# Altium schematic symbol library TI - ADC.SchLib: 2198 symbols (part 41 of 130)
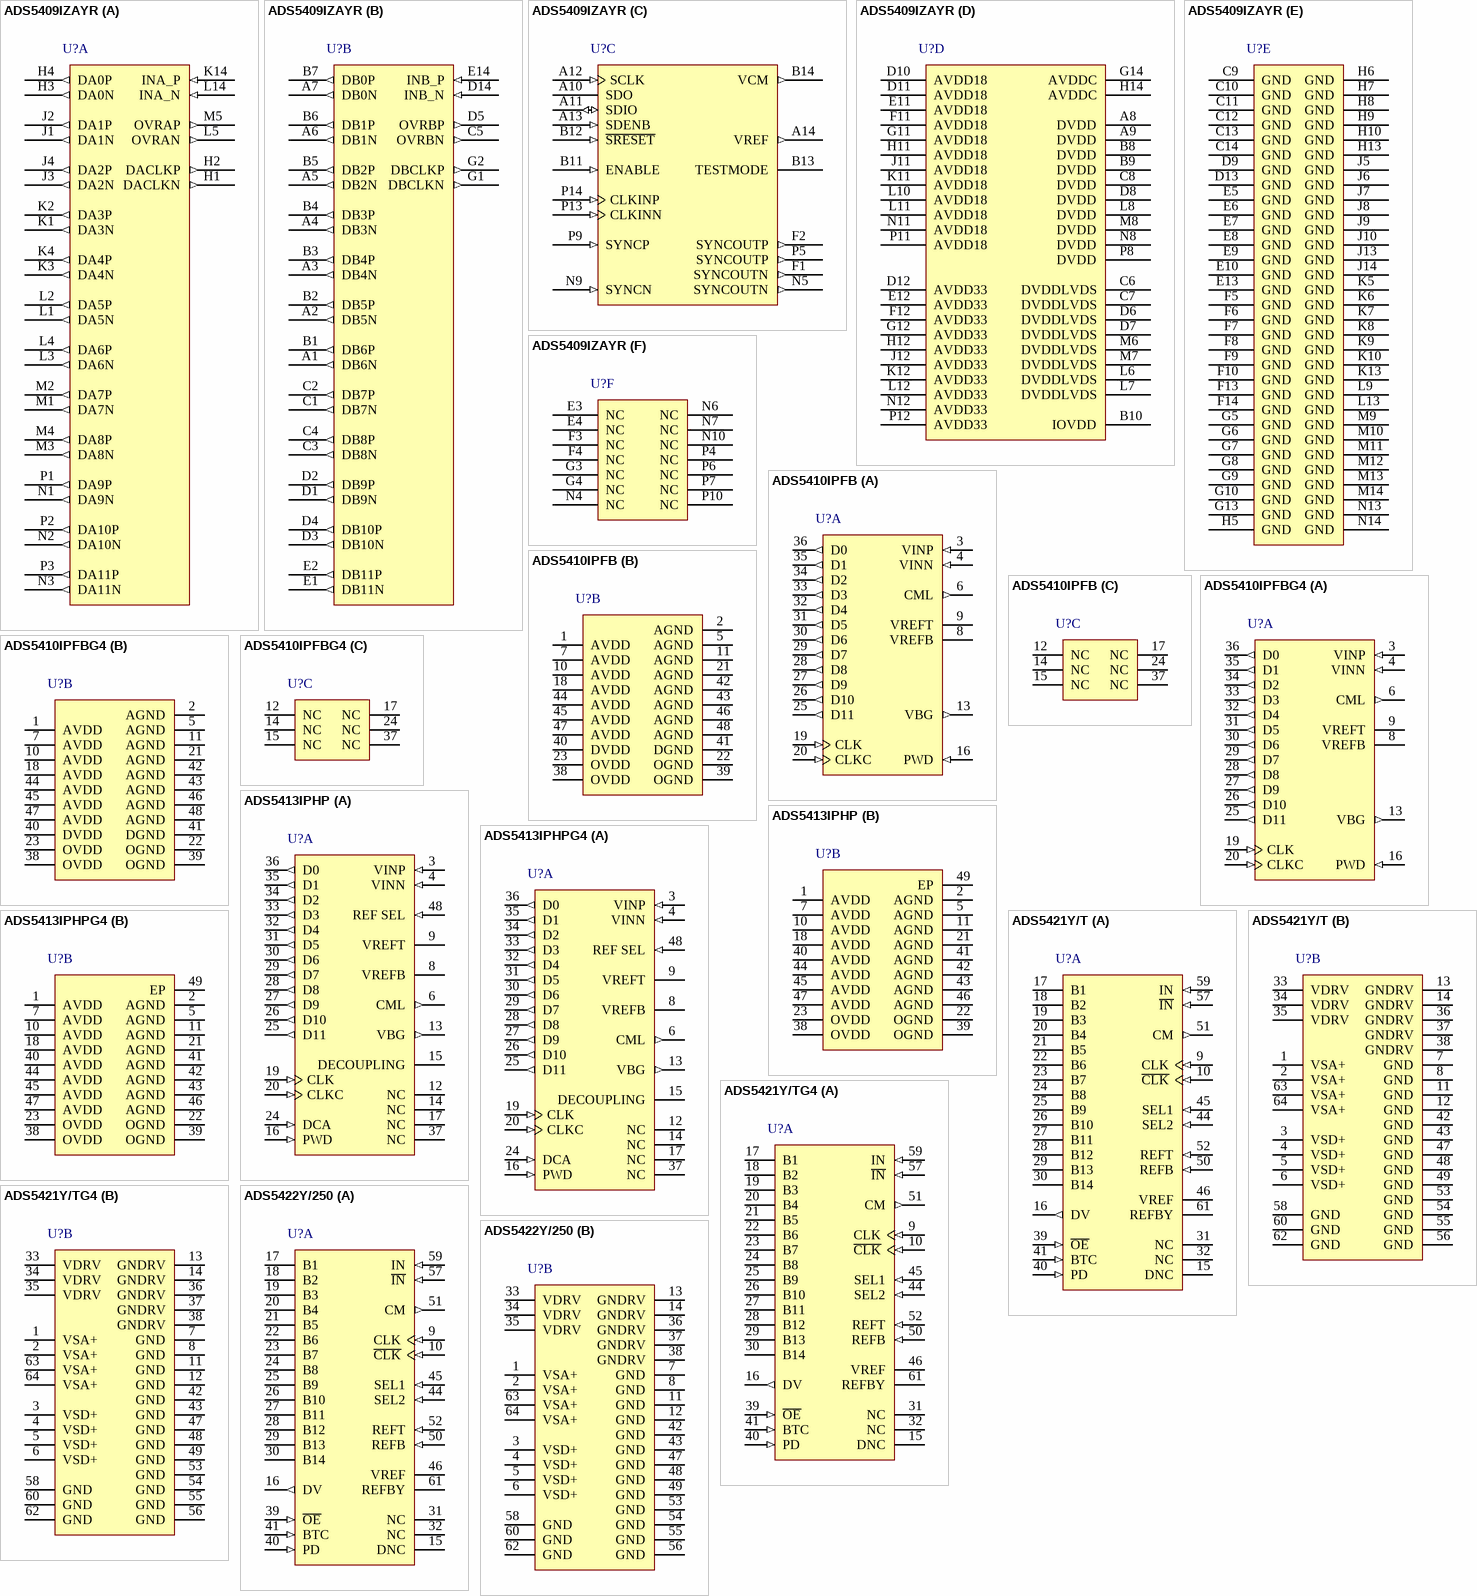
[diagram p166: symbols ADS5409IZAYR to ADS5422Y/250]

## ADS5421Y/T
designator U?
14-Bit, 40 MSPS Sampling ADC, -40 to 85 degC, 64-pin QFP (PM64), Green (RoHS & no Sb/Br); Manufacturer: Texas Instruments; PartNumber: ADS5421Y/T; # Input Channels: 1; Analog Voltage AV/DD(Max)(V): 5.25; Analog Voltage AV/DD(Min)(V): 4.75; Architecture: Pipeline; Digital Supply(Max)(V): 5; Digital Supply(Min)(V): 3; ENOB(Bits): 12.2; Interface: Parallel LVDS, Serial SPI Interface; Resolution(Bits): 14; Sample Rate (max)(SPS): 40M; SFDR(dB): 88; SINAD(dB): 75; SNR(dB): 76; SubFamily: High Speed ADC (>10MSPS); DatasheetVersion: SBAS237E; PackageVersion: 4040152/C, 11/1996; PackageReference: PM64; PackageDescription: 64-Pin Plastic Quad Flatpack, Body 10 x 10 mm, Pitch 0.5 mm; Supplier 1: Digi-Key; Supplier Part Number 1: ADS1602IPFBR-ND; Eco-Plan: Green (RoHS & no Sb/Br); Mounting Technology: Surface Mount; Code_JEDEC: MS-026; ComponentLink1Description: Manufacturer URL; ComponentLink1URL: http://www.ti.com/; ComponentLink2Description: Datasheet; ComponentLink2URL: http://www.ti.com/general/docs/lit/getliterature.tsp?genericPartNumber=ADS5421&fileType=pdf; ComponentLink3Description: Package Specification; ComponentLink3URL: http://www.ti.com/lit/ml/mtqf008a/mtqf008a.pdf
footprint TI-PM64_N (QFP, 64-Leads, Body 10x10mm, Pitch 0.5mm, IPC Medium Density)
footprint TI-PM64_L (QFP, 64-Leads, Body 10x10mm, Pitch 0.5mm, IPC High Density)
footprint TI-PM64_M (QFP, 64-Leads, Body 10x10mm, Pitch 0.5mm, IPC Low Density)
part A pins: 9 CLK (in) "Clock Input", 10 ~{CLK} (in) "Complementary Clock Input", 15 DNC "Do Not Connect", 16 DV (out) "Data Valid Pulse: HI = Data Valid", 17 B1 (hiz) "Data Bit 1 (D13) (MSB)", 18 B2 (hiz) "Data Bit 2 (D12)", 19 B3 (hiz) "Data Bit 3 (D11)", 20 B4 (hiz) "Data Bit 4 (D10)", 21 B5 (hiz) "Data Bit 5 (D9)", 22 B6 (hiz) "Data Bit 6 (D8)", 23 B7 (hiz) "Data Bit 7 (D7)", 24 B8 (hiz) "Data Bit 8 (D6)", 25 B9 (hiz) "Data Bit 9 (D5)", 26 B10 (hiz) "Data Bit 10 (D4)", 27 B11 (hiz) "Data Bit 11 (D3)", 28 B12 (hiz) "Data Bit 12 (D2)", 29 B13 (hiz) "Data Bit 13 (D1)", 30 B14 (hiz) "Data Bit 14 (D0) (LSB)", 31 NC "No Internal Connection", 32 NC "No Internal Connection", 39 ~{OE} (in) "Output Enable: HI = High Impedance", 40 PD (in) "Power Down: HI = Power Down; LO = Normal", 41 BTC (in) "HI = Binary Two‘s Complement", 44 SEL2 (in) "Reference Select 2: See Table on Page 5", 45 SEL1 (in) "Reference Select 1: See Table on Page 5", 46 VREF "Internal Reference Voltage", 50 REFB (in) "Bottom Reference Voltage Bypass", 51 CM (out) "Common-Mode Voltage (Midscale)", 52 REFT (in) "Top Reference Voltage Bypass", 57 ~{IN} (in) "Complementary Analog Input", 59 IN (in) "Analog Input", 61 REFBY "Reference Bypass"
part B pins: 1 VSA+ (power) "Analog Supply Voltage", 2 VSA+ (power) "Analog Supply Voltage", 3 VSD+ (power) "Digital Supply Voltage", 4 VSD+ (power) "Digital Supply Voltage", 5 VSD+ (power) "Digital Supply Voltage", 6 VSD+ (power) "Digital Supply Voltage", 7 GND (power) "Ground", 8 GND (power) "Ground", 11 GND (power) "Ground", 12 GND (power) "Ground", 13 GNDRV (power) "Ground", 14 GNDRV (power) "Ground", 33 VDRV (power) "Output Driver Supply Voltage", 34 VDRV (power) "Output Driver Supply Voltage", 35 VDRV (power) "Output Driver Supply Voltage", 36 GNDRV (power) "Ground", 37 GNDRV (power) "Ground", 38 GNDRV (power) "Ground", 42 GND (power) "Ground", 43 GND (power) "Ground", 47 GND (power) "Ground", 48 GND (power) "Ground", 49 GND (power) "Ground", 53 GND (power) "Ground", 54 GND (power) "Ground", 55 GND (power) "Ground", 56 GND (power) "Ground", 58 GND (power) "Ground", 60 GND (power) "Ground", 62 GND (power) "Ground", 63 VSA+ (power) "Analog Supply Voltage", 64 VSA+ (power) "Analog Supply Voltage"

## ADS5421Y/TG4
designator U?
14-Bit, 40 MSPS Sampling ADC, -40 to 85 degC, 64-pin QFP (PM64), Green (RoHS & no Sb/Br); Manufacturer: Texas Instruments; PartNumber: ADS5421Y/TG4; # Input Channels: 1; Analog Voltage AV/DD(Max)(V): 5.25; Analog Voltage AV/DD(Min)(V): 4.75; Architecture: Pipeline; Digital Supply(Max)(V): 5; Digital Supply(Min)(V): 3; ENOB(Bits): 12.2; Interface: Parallel LVDS, Serial SPI Interface; Resolution(Bits): 14; Sample Rate (max)(SPS): 40M; SFDR(dB): 88; SINAD(dB): 75; SNR(dB): 76; SubFamily: High Speed ADC (>10MSPS); DatasheetVersion: SBAS237E; PackageVersion: 4040152/C, 11/1996; PackageReference: PM64; PackageDescription: 64-Pin Plastic Quad Flatpack, Body 10 x 10 mm, Pitch 0.5 mm; Supplier 1: Digi-Key; Supplier Part Number 1: ADS1602IPFBRG4-ND; Eco-Plan: Green (RoHS & no Sb/Br); Mounting Technology: Surface Mount; Code_JEDEC: MS-026; ComponentLink1Description: Manufacturer URL; ComponentLink1URL: http://www.ti.com/; ComponentLink2Description: Datasheet; ComponentLink2URL: http://www.ti.com/general/docs/lit/getliterature.tsp?genericPartNumber=ADS5421&fileType=pdf; ComponentLink3Description: Package Specification; ComponentLink3URL: http://www.ti.com/lit/ml/mtqf008a/mtqf008a.pdf
footprint TI-PM64_N (QFP, 64-Leads, Body 10x10mm, Pitch 0.5mm, IPC Medium Density)
footprint TI-PM64_L (QFP, 64-Leads, Body 10x10mm, Pitch 0.5mm, IPC High Density)
footprint TI-PM64_M (QFP, 64-Leads, Body 10x10mm, Pitch 0.5mm, IPC Low Density)
part A pins: 9 CLK (in) "Clock Input", 10 ~{CLK} (in) "Complementary Clock Input", 15 DNC "Do Not Connect", 16 DV (out) "Data Valid Pulse: HI = Data Valid", 17 B1 (hiz) "Data Bit 1 (D13) (MSB)", 18 B2 (hiz) "Data Bit 2 (D12)", 19 B3 (hiz) "Data Bit 3 (D11)", 20 B4 (hiz) "Data Bit 4 (D10)", 21 B5 (hiz) "Data Bit 5 (D9)", 22 B6 (hiz) "Data Bit 6 (D8)", 23 B7 (hiz) "Data Bit 7 (D7)", 24 B8 (hiz) "Data Bit 8 (D6)", 25 B9 (hiz) "Data Bit 9 (D5)", 26 B10 (hiz) "Data Bit 10 (D4)", 27 B11 (hiz) "Data Bit 11 (D3)", 28 B12 (hiz) "Data Bit 12 (D2)", 29 B13 (hiz) "Data Bit 13 (D1)", 30 B14 (hiz) "Data Bit 14 (D0) (LSB)", 31 NC "No Internal Connection", 32 NC "No Internal Connection", 39 ~{OE} (in) "Output Enable: HI = High Impedance", 40 PD (in) "Power Down: HI = Power Down; LO = Normal", 41 BTC (in) "HI = Binary Two‘s Complement", 44 SEL2 (in) "Reference Select 2: See Table on Page 5", 45 SEL1 (in) "Reference Select 1: See Table on Page 5", 46 VREF "Internal Reference Voltage", 50 REFB (in) "Bottom Reference Voltage Bypass", 51 CM (out) "Common-Mode Voltage (Midscale)", 52 REFT (in) "Top Reference Voltage Bypass", 57 ~{IN} (in) "Complementary Analog Input", 59 IN (in) "Analog Input", 61 REFBY "Reference Bypass"
part B pins: 1 VSA+ (power) "Analog Supply Voltage", 2 VSA+ (power) "Analog Supply Voltage", 3 VSD+ (power) "Digital Supply Voltage", 4 VSD+ (power) "Digital Supply Voltage", 5 VSD+ (power) "Digital Supply Voltage", 6 VSD+ (power) "Digital Supply Voltage", 7 GND (power) "Ground", 8 GND (power) "Ground", 11 GND (power) "Ground", 12 GND (power) "Ground", 13 GNDRV (power) "Ground", 14 GNDRV (power) "Ground", 33 VDRV (power) "Output Driver Supply Voltage", 34 VDRV (power) "Output Driver Supply Voltage", 35 VDRV (power) "Output Driver Supply Voltage", 36 GNDRV (power) "Ground", 37 GNDRV (power) "Ground", 38 GNDRV (power) "Ground", 42 GND (power) "Ground", 43 GND (power) "Ground", 47 GND (power) "Ground", 48 GND (power) "Ground", 49 GND (power) "Ground", 53 GND (power) "Ground", 54 GND (power) "Ground", 55 GND (power) "Ground", 56 GND (power) "Ground", 58 GND (power) "Ground", 60 GND (power) "Ground", 62 GND (power) "Ground", 63 VSA+ (power) "Analog Supply Voltage", 64 VSA+ (power) "Analog Supply Voltage"

## ADS5422Y/250
designator U?
14-Bit, 62 MSPS Sampling ADC, -40 to 85 degC, 64-pin QFP (PM64), Green (RoHS & no Sb/Br); Manufacturer: Texas Instruments; PartNumber: ADS5422Y/250; # Input Channels: 1; Analog Voltage AV/DD(Max)(V): 5.25; Analog Voltage AV/DD(Min)(V): 4.75; Architecture: Pipeline; Digital Supply(Max)(V): 5; Digital Supply(Min)(V): 3; ENOB(Bits): 11.7; Interface: Parallel LVDS, Serial SPI Interface; Resolution(Bits): 14; Sample Rate (max)(SPS): 62M; SFDR(dB): 85; SINAD(dB): 72; SNR(dB): 73; SubFamily: High Speed ADC (>10MSPS); DatasheetVersion: SBAS250D; PackageVersion: 4040152/C, 11/1996; PackageReference: PM64; PackageDescription: 64-Pin Plastic Quad Flatpack, Body 10 x 10 mm, Pitch 0.5 mm; Supplier 1: Digi-Key; Supplier Part Number 1: 296-17890-2-ND; Eco-Plan: Green (RoHS & no Sb/Br); Mounting Technology: Surface Mount; Code_JEDEC: MS-026; ComponentLink1Description: Manufacturer URL; ComponentLink1URL: http://www.ti.com/; ComponentLink2Description: Datasheet; ComponentLink2URL: http://www.ti.com/general/docs/lit/getliterature.tsp?genericPartNumber=ADS5422&fileType=pdf; ComponentLink3Description: Package Specification; ComponentLink3URL: http://www.ti.com/lit/ml/mtqf008a/mtqf008a.pdf
footprint TI-PM64_N (QFP, 64-Leads, Body 10x10mm, Pitch 0.5mm, IPC Medium Density)
footprint TI-PM64_L (QFP, 64-Leads, Body 10x10mm, Pitch 0.5mm, IPC High Density)
footprint TI-PM64_M (QFP, 64-Leads, Body 10x10mm, Pitch 0.5mm, IPC Low Density)
part A pins: 9 CLK (in) "Clock Input", 10 ~{CLK} (in) "Complementary Clock Input", 15 DNC "Do Not Connect", 16 DV (out) "Data Valid Pulse: HI = Data Valid", 17 B1 (hiz) "Data Bit 1 (D13) (MSB)", 18 B2 (hiz) "Data Bit 2 (D12)", 19 B3 (hiz) "Data Bit 3 (D11)", 20 B4 (hiz) "Data Bit 4 (D10)", 21 B5 (hiz) "Data Bit 5 (D9)", 22 B6 (hiz) "Data Bit 6 (D8)", 23 B7 (hiz) "Data Bit 7 (D7)", 24 B8 (hiz) "Data Bit 8 (D6)", 25 B9 (hiz) "Data Bit 9 (D5)", 26 B10 (hiz) "Data Bit 10 (D4)", 27 B11 (hiz) "Data Bit 11 (D3)", 28 B12 (hiz) "Data Bit 12 (D2)", 29 B13 (hiz) "Data Bit 13 (D1)", 30 B14 (hiz) "Data Bit 14 (D0) (LSB)", 31 NC "No Internal Connection", 32 NC "No Internal Connection", 39 ~{OE} (in) "Output Enable: HI = High Impedance", 40 PD (in) "Power Down: HI = Power Down; LO = Normal", 41 BTC (in) "HI = Binary Two‘s Complement", 44 SEL2 (in) "Reference Select 2: See Table on Page 5", 45 SEL1 (in) "Reference Select 1: See Table on Page 5", 46 VREF "Internal Reference Voltage", 50 REFB (in) "Bottom Reference Voltage Bypass", 51 CM (out) "Common-Mode Voltage (Midscale)", 52 REFT (in) "Top Reference Voltage Bypass", 57 ~{IN} (in) "Complementary Analog Input", 59 IN (in) "Analog Input", 61 REFBY "Reference Bypass"
part B pins: 1 VSA+ (power) "Analog Supply Voltage", 2 VSA+ (power) "Analog Supply Voltage", 3 VSD+ (power) "Digital Supply Voltage", 4 VSD+ (power) "Digital Supply Voltage", 5 VSD+ (power) "Digital Supply Voltage", 6 VSD+ (power) "Digital Supply Voltage", 7 GND (power) "Ground", 8 GND (power) "Ground", 11 GND (power) "Ground", 12 GND (power) "Ground", 13 GNDRV (power) "Ground", 14 GNDRV (power) "Ground", 33 VDRV (power) "Output Driver Supply Voltage", 34 VDRV (power) "Output Driver Supply Voltage", 35 VDRV (power) "Output Driver Supply Voltage", 36 GNDRV (power) "Ground", 37 GNDRV (power) "Ground", 38 GNDRV (power) "Ground", 42 GND (power) "Ground", 43 GND (power) "Ground", 47 GND (power) "Ground", 48 GND (power) "Ground", 49 GND (power) "Ground", 53 GND (power) "Ground", 54 GND (power) "Ground", 55 GND (power) "Ground", 56 GND (power) "Ground", 58 GND (power) "Ground", 60 GND (power) "Ground", 62 GND (power) "Ground", 63 VSA+ (power) "Analog Supply Voltage", 64 VSA+ (power) "Analog Supply Voltage"

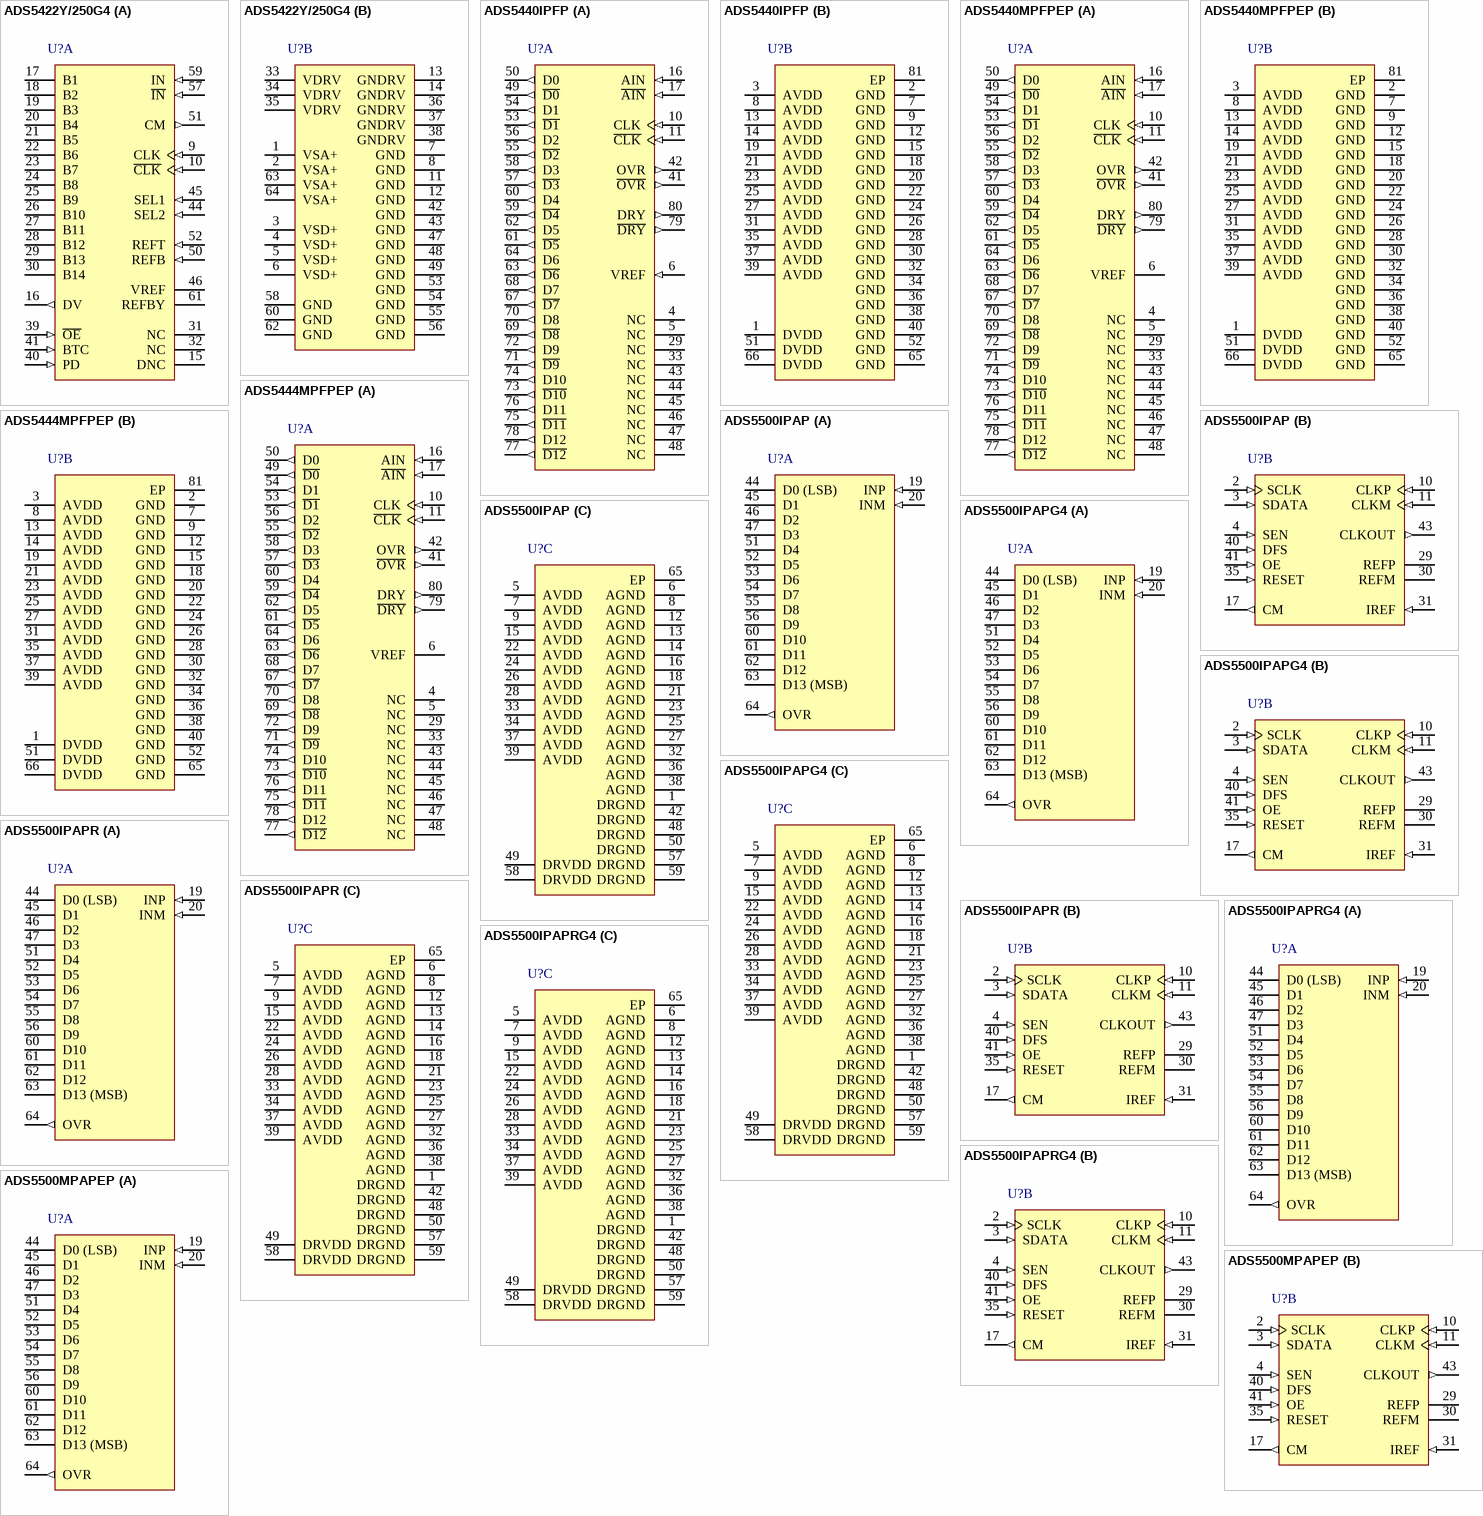
[diagram p51: symbols ADS5422Y/250G4 to ADS5500MPAPEP]

## ADS5422Y/250G4
designator U?
14-Bit, 62 MSPS Sampling ADC, -40 to 85 degC, 64-pin QFP (PM64), Green (RoHS & no Sb/Br); Manufacturer: Texas Instruments; PartNumber: ADS5422Y/250G4; # Input Channels: 1; Analog Voltage AV/DD(Max)(V): 5.25; Analog Voltage AV/DD(Min)(V): 4.75; Architecture: Pipeline; Digital Supply(Max)(V): 5; Digital Supply(Min)(V): 3; ENOB(Bits): 11.7; Interface: Parallel LVDS, Serial SPI Interface; Resolution(Bits): 14; Sample Rate (max)(SPS): 62M; SFDR(dB): 85; SINAD(dB): 72; SNR(dB): 73; SubFamily: High Speed ADC (>10MSPS); DatasheetVersion: SBAS250D; PackageVersion: 4040152/C, 11/1996; PackageReference: PM64; PackageDescription: 64-Pin Plastic Quad Flatpack, Body 10 x 10 mm, Pitch 0.5 mm; Supplier 1: Digi-Key; Supplier Part Number 1: ADS1602IPFBTG4-ND; Eco-Plan: Green (RoHS & no Sb/Br); Mounting Technology: Surface Mount; Code_JEDEC: MS-026; ComponentLink1Description: Manufacturer URL; ComponentLink1URL: http://www.ti.com/; ComponentLink2Description: Datasheet; ComponentLink2URL: http://www.ti.com/general/docs/lit/getliterature.tsp?genericPartNumber=ADS5422&fileType=pdf; ComponentLink3Description: Package Specification; ComponentLink3URL: http://www.ti.com/lit/ml/mtqf008a/mtqf008a.pdf
footprint TI-PM64_N (QFP, 64-Leads, Body 10x10mm, Pitch 0.5mm, IPC Medium Density)
footprint TI-PM64_L (QFP, 64-Leads, Body 10x10mm, Pitch 0.5mm, IPC High Density)
footprint TI-PM64_M (QFP, 64-Leads, Body 10x10mm, Pitch 0.5mm, IPC Low Density)
part A pins: 9 CLK (in) "Clock Input", 10 ~{CLK} (in) "Complementary Clock Input", 15 DNC "Do Not Connect", 16 DV (out) "Data Valid Pulse: HI = Data Valid", 17 B1 (hiz) "Data Bit 1 (D13) (MSB)", 18 B2 (hiz) "Data Bit 2 (D12)", 19 B3 (hiz) "Data Bit 3 (D11)", 20 B4 (hiz) "Data Bit 4 (D10)", 21 B5 (hiz) "Data Bit 5 (D9)", 22 B6 (hiz) "Data Bit 6 (D8)", 23 B7 (hiz) "Data Bit 7 (D7)", 24 B8 (hiz) "Data Bit 8 (D6)", 25 B9 (hiz) "Data Bit 9 (D5)", 26 B10 (hiz) "Data Bit 10 (D4)", 27 B11 (hiz) "Data Bit 11 (D3)", 28 B12 (hiz) "Data Bit 12 (D2)", 29 B13 (hiz) "Data Bit 13 (D1)", 30 B14 (hiz) "Data Bit 14 (D0) (LSB)", 31 NC "No Internal Connection", 32 NC "No Internal Connection", 39 ~{OE} (in) "Output Enable: HI = High Impedance", 40 PD (in) "Power Down: HI = Power Down; LO = Normal", 41 BTC (in) "HI = Binary Two‘s Complement", 44 SEL2 (in) "Reference Select 2: See Table on Page 5", 45 SEL1 (in) "Reference Select 1: See Table on Page 5", 46 VREF "Internal Reference Voltage", 50 REFB (in) "Bottom Reference Voltage Bypass", 51 CM (out) "Common-Mode Voltage (Midscale)", 52 REFT (in) "Top Reference Voltage Bypass", 57 ~{IN} (in) "Complementary Analog Input", 59 IN (in) "Analog Input", 61 REFBY "Reference Bypass"
part B pins: 1 VSA+ (power) "Analog Supply Voltage", 2 VSA+ (power) "Analog Supply Voltage", 3 VSD+ (power) "Digital Supply Voltage", 4 VSD+ (power) "Digital Supply Voltage", 5 VSD+ (power) "Digital Supply Voltage", 6 VSD+ (power) "Digital Supply Voltage", 7 GND (power) "Ground", 8 GND (power) "Ground", 11 GND (power) "Ground", 12 GND (power) "Ground", 13 GNDRV (power) "Ground", 14 GNDRV (power) "Ground", 33 VDRV (power) "Output Driver Supply Voltage", 34 VDRV (power) "Output Driver Supply Voltage", 35 VDRV (power) "Output Driver Supply Voltage", 36 GNDRV (power) "Ground", 37 GNDRV (power) "Ground", 38 GNDRV (power) "Ground", 42 GND (power) "Ground", 43 GND (power) "Ground", 47 GND (power) "Ground", 48 GND (power) "Ground", 49 GND (power) "Ground", 53 GND (power) "Ground", 54 GND (power) "Ground", 55 GND (power) "Ground", 56 GND (power) "Ground", 58 GND (power) "Ground", 60 GND (power) "Ground", 62 GND (power) "Ground", 63 VSA+ (power) "Analog Supply Voltage", 64 VSA+ (power) "Analog Supply Voltage"

## ADS5440IPFP
designator U?
13-Bit, 210 MSPS Pipeline ADC, -40 to 85 degC, 80-pin QFP (PFP80), Green (RoHS & no Sb/Br); Manufacturer: Texas Instruments; PartNumber: ADS5440IPFP; # Input Channels: 1; Analog Voltage AV/DD(Max)(V): 5.25; Analog Voltage AV/DD(Min)(V): 4.75; Digital Supply(Max)(V): 3.6; Digital Supply(Min)(V): 3; ENOB(Bits): 11.4; INL(Max)(+/-LSB): 2.2; Interface: Parallel LVDS; Resolution(Bits): 13; Sample Rate (max)(SPS): 210M; SFDR(dB): 76; SINAD(dB): 68; SNR(dB): 69; SubFamily: High Speed ADC (>10MSPS); DatasheetVersion: SLAS467A; PackageVersion: 4146925/C, 07/2011; PackageReference: PFP80-6825X6825TP; PackageDescription: 80-Pin PowerPAD(TM) Plastic Quad Flatpack, Body 12 x 12 mm, Pitch 0.5 mm; Supplier 1: Digi-Key; Supplier Part Number 1: 296-25640-2-ND; Architecture: Pipeline; Eco-Plan: Green (RoHS & no Sb/Br); Mounting Technology: Surface Mount; Code_JEDEC: MS-026; ComponentLink1Description: Manufacturer URL; ComponentLink1URL: http://www.ti.com/; ComponentLink2Description: Datasheet; ComponentLink2URL: http://www.ti.com/general/docs/lit/getliterature.tsp?genericPartNumber=ADS5440&fileType=pdf; ComponentLink3Description: Package Specification; ComponentLink3URL: http://www.ti.com/litv/pdf/mpqf049b
footprint TI-PFP80-6825X6825TP_N (QFP, 80-Leads, Body 12x12mm, Pitch 0.5mm, Thermal Pad 7.5x7.5mm, IPC Medium Density)
footprint TI-PFP80-6825X6825TP_L (QFP, 80-Leads, Body 12x12mm, Pitch 0.5mm, Thermal Pad 7.5x7.5mm, IPC High Density)
footprint TI-PFP80-6825X6825TP_M (QFP, 80-Leads, Body 12x12mm, Pitch 0.5mm, Thermal Pad 7.5x7.5mm, IPC Low Density)
part A pins: 4 NC "No connect", 5 NC "No connect", 6 VREF (in) "Reference voltage", 10 CLK (in) "Differential input clock (positive). Conversion initiated on rising edge", 11 ~{CLK} (in) "Differential input clock (negative)", 16 AIN (in) "Differential input signal (positive)", 17 ~{AIN} (in) "Differential input signal (negative)", 29 NC "No connect", 33 NC "No connect", 41 ~{OVR} (out) "Over range indicator LVDS output. A logic high signals an analog input in excess of the full-scale range", 42 OVR (out) "Over range indicator LVDS output. A logic high signals an analog input in excess of the full-scale range", 43 NC "No connect", 44 NC "No connect", 45 NC "No connect", 46 NC "No connect", 47 NC "No connect", 48 NC "No connect", 49 ~{D0} (out) "LVDS digital output pair, least-significant bit (LSB)", 50 D0 (out) "LVDS digital output pair, least-significant bit (LSB)", 53 ~{D1} (out) "LVDS digital output pairs", 54 D1 (out) "LVDS digital output pairs", 55 ~{D2} (out) "LVDS digital output pairs", 56 D2 (out) "LVDS digital output pairs", 57 ~{D3} (out) "LVDS digital output pairs", 58 D3 (out) "LVDS digital output pairs", 59 ~{D4} (out) "LVDS digital output pairs", 60 D4 (out) "LVDS digital output pairs", 61 ~{D5} (out) "LVDS digital output pairs", 62 D5 (out) "LVDS digital output pairs", 63 ~{D6} (out) "LVDS digital output pairs", 64 D6 (out) "LVDS digital output pairs", 67 ~{D7} (out) "LVDS digital output pairs", 68 D7 (out) "LVDS digital output pairs", 69 ~{D8} (out) "LVDS digital output pairs", 70 D8 (out) "LVDS digital output pairs", 71 ~{D9} (out) "LVDS digital output pairs", 72 D9 (out) "LVDS digital output pairs", 73 ~{D10} (out) "LVDS digital output pairs", 74 D10 (out) "LVDS digital output pairs", 75 ~{D11} (out) "LVDS digital output pairs", 76 D11 (out) "LVDS digital output pairs", 77 ~{D12} (out) "LVDS digital output pair, most-significant bit (MSB)", 78 D12 (out) "LVDS digital output pair, most-significant bit (MSB)", 79 ~{DRY} (out) "Data ready LVDS output pair", 80 DRY (out) "Data ready LVDS output pair"
part B pins: 1 DVDD (power) "Output driver power supply", 2 GND (power) "Ground", 3 AVDD (power) "Analog power supply", 7 GND (power) "Ground", 8 AVDD (power) "Analog power supply", 9 GND (power) "Ground", 12 GND (power) "Ground", 13 AVDD (power) "Analog power supply", 14 AVDD (power) "Analog power supply", 15 GND (power) "Ground", 18 GND (power) "Ground", 19 AVDD (power) "Analog power supply", 20 GND (power) "Ground", 21 AVDD (power) "Analog power supply", 22 GND (power) "Ground", 23 AVDD (power) "Analog power supply", 24 GND (power) "Ground", 25 AVDD (power) "Analog power supply", 26 GND (power) "Ground", 27 AVDD (power) "Analog power supply", 28 GND (power) "Ground", 30 GND (power) "Ground", 31 AVDD (power) "Analog power supply", 32 GND (power) "Ground", 34 GND (power) "Ground", 35 AVDD (power) "Analog power supply", 36 GND (power) "Ground", 37 AVDD (power) "Analog power supply", 38 GND (power) "Ground", 39 AVDD (power) "Analog power supply", 40 GND (power) "Ground", 51 DVDD (power) "Output driver power supply", 52 GND (power) "Ground", 65 GND (power) "Ground", 66 DVDD (power) "Output driver power supply", 81 EP (power)

## ADS5440MPFPEP
designator U?
Enhanced Product 13-Bit 210 MSPS ADC, -55 to 125 degC, 80-pin QFP (PFP80), Green (RoHS & no Sb/Br); Manufacturer: Texas Instruments; PartNumber: ADS5440MPFPEP; # Input Channels: 1; Analog Voltage AV/DD(Max)(V): 5.25; Analog Voltage AV/DD(Min)(V): 4.75; Architecture: Pipeline; Digital Supply(Max)(V): 3.6; Digital Supply(Min)(V): 3; ENOB(Bits): 11.4; INL(Max)(+/-LSB): 2.2; Interface: Parallel LVDS; Resolution(Bits): 13; Sample Rate (max)(SPS): 210M; SFDR(dB): 76; SINAD(dB): 68; SNR(dB): 69; SubFamily: High Speed ADC (>10MSPS); DatasheetVersion: SGLS359; PackageVersion: 4146925/C, 07/2011; PackageReference: PFP80-6825X6825TP; PackageDescription: 80-Pin PowerPAD(TM) Plastic Quad Flatpack, Body 12 x 12 mm, Pitch 0.5 mm; Supplier 1: Digi-Key; Supplier Part Number 1: ADS5204IPFBRQ1-ND; Eco-Plan: Green (RoHS & no Sb/Br); Mounting Technology: Surface Mount; Code_JEDEC: MS-026; ComponentLink1Description: Manufacturer URL; ComponentLink1URL: http://www.ti.com/; ComponentLink2Description: Datasheet; ComponentLink2URL: http://www.ti.com/general/docs/lit/getliterature.tsp?genericPartNumber=ADS5440-EP&fileType=pdf; ComponentLink3Description: Package Specification; ComponentLink3URL: http://www.ti.com/litv/pdf/mpqf049b
footprint TI-PFP80-6825X6825TP_N (QFP, 80-Leads, Body 12x12mm, Pitch 0.5mm, Thermal Pad 7.5x7.5mm, IPC Medium Density)
footprint TI-PFP80-6825X6825TP_L (QFP, 80-Leads, Body 12x12mm, Pitch 0.5mm, Thermal Pad 7.5x7.5mm, IPC High Density)
footprint TI-PFP80-6825X6825TP_M (QFP, 80-Leads, Body 12x12mm, Pitch 0.5mm, Thermal Pad 7.5x7.5mm, IPC Low Density)
part A pins: 4 NC "No connect", 5 NC "No connect", 6 VREF "Reference voltage", 10 CLK (in) "Differential input clock (positive). Conversion initiated on rising edge", 11 ~{CLK} (in) "Differential input clock (negative)", 16 AIN (in) "Differential input signal (positive)", 17 ~{AIN} (in) "Differential input signal (negative)", 29 NC "No connect", 33 NC "No connect", 41 ~{OVR} (out) "Over range indicator LVDS output. A logic high signals an analog input in excess of the full-scale range", 42 OVR (out) "Over range indicator LVDS output. A logic high signals an analog input in excess of the full-scale range", 43 NC "No connect", 44 NC "No connect", 45 NC "No connect", 46 NC "No connect", 47 NC "No connect", 48 NC "No connect", 49 ~{D0} (out) "LVDS digital output pair, least-significant bit (LSB)", 50 D0 (out) "LVDS digital output pair, least-significant bit (LSB)", 53 ~{D1} (out) "LVDS digital output pairs", 54 D1 (out) "LVDS digital output pairs", 55 ~{D2} (out) "LVDS digital output pairs", 56 D2 (out) "LVDS digital output pairs", 57 ~{D3} (out) "LVDS digital output pairs", 58 D3 (out) "LVDS digital output pairs", 59 ~{D4} (out) "LVDS digital output pairs", 60 D4 (out) "LVDS digital output pairs", 61 ~{D5} (out) "LVDS digital output pairs", 62 D5 (out) "LVDS digital output pairs", 63 ~{D6} (out) "LVDS digital output pairs", 64 D6 (out) "LVDS digital output pairs", 67 ~{D7} (out) "LVDS digital output pairs", 68 D7 (out) "LVDS digital output pairs", 69 ~{D8} (out) "LVDS digital output pairs", 70 D8 (out) "LVDS digital output pairs", 71 ~{D9} (out) "LVDS digital output pairs", 72 D9 (out) "LVDS digital output pairs", 73 ~{D10} (out) "LVDS digital output pairs", 74 D10 (out) "LVDS digital output pairs", 75 ~{D11} (out) "LVDS digital output pairs", 76 D11 (out) "LVDS digital output pairs", 77 ~{D12} (out) "LVDS digital output pair, most-significant bit (MSB)", 78 D12 (out) "LVDS digital output pair, most-significant bit (MSB)", 79 ~{DRY} (out) "Data ready LVDS output pair", 80 DRY (out) "Data ready LVDS output pair"
part B pins: 1 DVDD (power) "Output driver power supply", 2 GND (power) "Ground", 3 AVDD (power) "Analog power supply", 7 GND (power) "Ground", 8 AVDD (power) "Analog power supply", 9 GND (power) "Ground", 12 GND (power) "Ground", 13 AVDD (power) "Analog power supply", 14 AVDD (power) "Analog power supply", 15 GND (power) "Ground", 18 GND (power) "Ground", 19 AVDD (power) "Analog power supply", 20 GND (power) "Ground", 21 AVDD (power) "Analog power supply", 22 GND (power) "Ground", 23 AVDD (power) "Analog power supply", 24 GND (power) "Ground", 25 AVDD (power) "Analog power supply", 26 GND (power) "Ground", 27 AVDD (power) "Analog power supply", 28 GND (power) "Ground", 30 GND (power) "Ground", 31 AVDD (power) "Analog power supply", 32 GND (power) "Ground", 34 GND (power) "Ground", 35 AVDD (power) "Analog power supply", 36 GND (power) "Ground", 37 AVDD (power) "Analog power supply", 38 GND (power) "Ground", 39 AVDD (power) "Analog power supply", 40 GND (power) "Ground", 51 DVDD (power) "Output driver power supply", 52 GND (power) "Ground", 65 GND (power) "Ground", 66 DVDD (power) "Output driver power supply", 81 EP (power)
